# Altium footprint library Transformers.PcbLib: 93 footprints (part 5 of 7)
Each footprint in its own frame and in the unit in brackets; x right, y up, seen from the top. Pads: shape width x height; smd on the part's side, far side on the other; paste and mask are expansions set on the pad; w line width, h text height; cw(c..) or ccw(c..) is an arc to the next point about the centre after c.
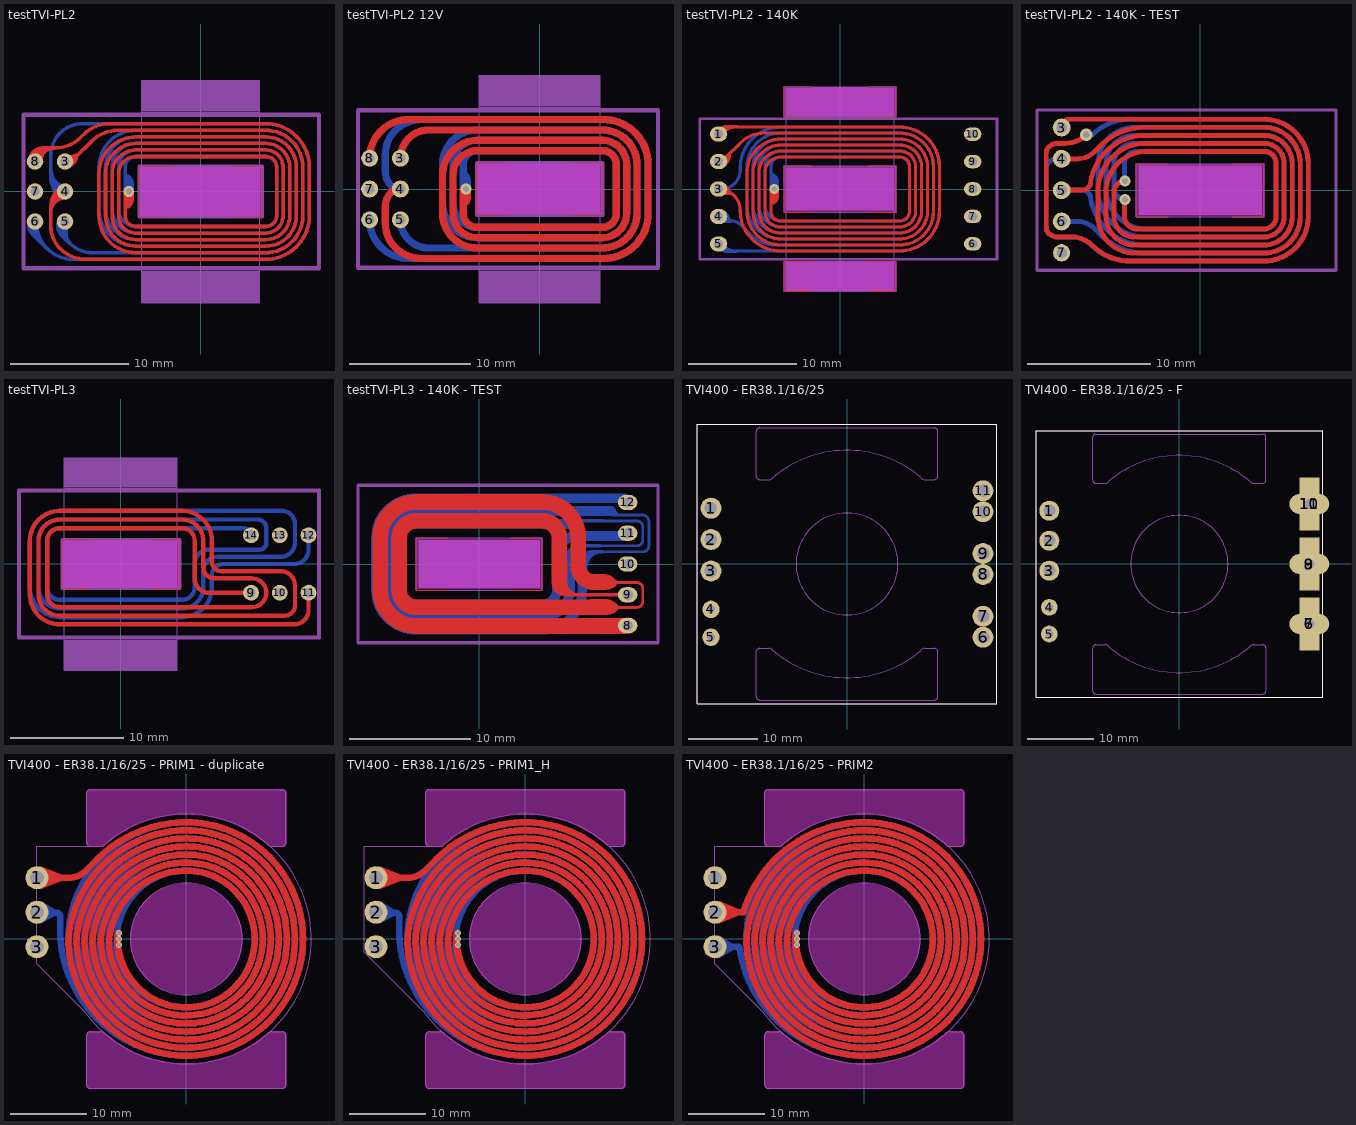
[diagram p4: the footprints below, top view; thin cyan lines are the x and y axes]

## testTVI-PL2 [mm]
pads (6):
  round 1.4 hole 0.8: 3(-11.5,2.54) 4(-11.5,0) 5(-11.5,-2.54) 6(-14.04,-2.54) 7(-14.04,0) 8(-14.04,2.54)
via -6.1,0 diameter 0.9 hole 0.5
Top Layer:
  region: -5.7,0 -5.7,-0.7 -5.7,-0.779 -5.731,-0.933 -5.791,-1.079 -5.879,-1.21 -5.99,-1.321 -6.121,-1.409 -6.267,-1.469 -6.421,-1.5 -6.5,-1.5 -6.5,0 -6.5,0.08 -6.439,0.227 -6.327,0.339 -6.18,0.4 -6.1,0.4
  region: -11.669,1.869 -11.541,1.869 -11.29,1.919 -11.053,2.017 -10.841,2.159 -10.659,2.341 -10.517,2.553 -10.419,2.79 -10.369,3.041 -10.369,3.169 -10.369,3.25 -10.5,3.25 -10.637,3.188 -10.923,3.096 -11.22,3.05 -11.52,3.051 -11.669,3.069
  region: -11.331,0.539 -11.481,0.526 -11.77,0.446 -12.039,0.314 -12.279,0.135 -12.483,-0.086 -12.641,-0.341 -12.75,-0.62 -12.806,-0.915 -12.806,-1.065 -12.806,-1.801 -12.628,-1.801 -12.614,-1.682 -12.552,-1.45 -12.447,-1.236 -12.301,-1.046 -12.122,-0.888 -11.915,-0.768 -11.688,-0.691 -11.451,-0.66 -11.331,-0.661
  region: -14.64,2.54 -14.64,2.668 -14.59,2.919 -14.492,3.156 -14.35,3.369 -14.169,3.55 -13.956,3.692 -13.719,3.79 -13.468,3.84 -13.34,3.84 -12.34,3.84 -12.34,3.54 -12.44,3.54 -12.538,3.535 -12.73,3.497 -12.911,3.422 -13.074,3.313 -13.213,3.174 -13.322,3.011 -13.397,2.83 -13.435,2.638 -13.44,2.54
  lines w0.1: -2.6,-2.15 -5.2,-2.15 -5.2,2.15 -2.6,2.15 ; 2.6,-2.15 5.2,-2.15 5.2,2.15 2.6,2.15
  lines w0.3: -13.763,2.817 -14.04,2.54 -13.238,3.342 ; -12.34,3.69 -12.33,3.69 ccw(c-12.33,6.756) -10.162,4.588 -9.916,4.834 cw(c-7.748,2.666) -7.748,5.732 -6.748,5.732 -5.5,5.732 ; -12.25,-0.25 cw(c-11.646,-0.854) -11.646,0 ; -12.1,0 ccw(c-10.651,-1.449) -12.7,-1.449 -12.7,-2.941 ccw(c-10.023,-2.941) -11.916,-4.834 ccw(c-9.748,-2.666) -9.748,-5.732 -8.248,-5.732 ; -11.852,-0.102 -11.75,0 ; -11.27,2.54 -11.5,2.54 ; -10.646,2.894 cw(c-11.5,3.747) -11.5,2.54 ; -8.748,-5.732 -7.748,-5.732 ; -6.75,-5.732 -7.748,-5.732 ; -6.5,-5.732 -5.5,-5.732 ; -6.412,0 -6.412,-2.05 ccw(c-5.5,-2.05) -5.5,-2.962 5.5,-2.962 ccw(c5.5,-2.05) 6.412,-2.05 6.412,2.05 ccw(c5.5,2.05) 5.5,2.962 -5.5,2.962 ccw(c-5.5,1.496) -6.966,1.496 -6.966,0 -6.966,-2.05 ccw(c-5.5,-2.05) -5.5,-3.516 5.5,-3.516 ccw(c5.5,-2.05) 6.966,-2.05 6.966,2.05 ccw(c5.5,2.05) 5.5,3.516 -5.5,3.516 ccw(c-5.5,1.496) -7.52,1.496 -7.52,0 -7.52,-2.05 ccw(c-5.5,-2.05) -5.5,-4.07 5.5,-4.07 ccw(c5.5,-2.05) 7.52,-2.05 7.52,2.05 ccw(c5.5,2.05) 5.5,4.07 -5.5,4.07 ccw(c-5.5,1.496) -8.074,1.496 -8.074,0 -8.074,-2.05 ccw(c-5.5,-2.05) -5.5,-4.624 5.5,-4.624 ccw(c5.5,-2.05) 8.074,-2.05 8.074,2.05 ccw(c5.5,2.05) 5.5,4.624 -5.5,4.624 ccw(c-5.5,1.496) -8.628,1.496 -8.628,0 -8.628,-2.05 ccw(c-5.5,-2.05) -5.5,-5.178 5.5,-5.178 ccw(c5.5,-2.05) 8.628,-2.05 8.628,2.05 ccw(c5.5,2.05) 5.5,5.178 -5.5,5.178 ; -6,5.732 -5.5,5.732 ; -5.546,5.178 -4,5.178 ; -5,5.178 -6.092,5.178 -7.052,5.178 ccw(c-7.052,2.112) -9.22,4.28 -10.578,2.922 cw(c-11.5,3.844) -11.5,2.54 ; -7.748,-5.732 -5.5,-5.732 ; -5.5,-5.732 5.5,-5.732 ccw(c5.5,-2.05) 9.182,-2.05 9.182,2.05 ccw(c5.5,2.05) 5.5,5.732 -5.5,5.732
Bottom Layer:
  region: -5.7,0 -5.7,0.7 -5.7,0.779 -5.731,0.933 -5.791,1.079 -5.879,1.21 -5.99,1.321 -6.121,1.409 -6.267,1.469 -6.421,1.5 -6.5,1.5 -6.5,0 -6.5,-0.08 -6.439,-0.227 -6.327,-0.339 -6.18,-0.4 -6.1,-0.4
  region: -11.366,-0.677 -11.494,-0.677 -11.745,-0.627 -11.981,-0.529 -12.194,-0.387 -12.375,-0.206 -12.518,0.007 -12.616,0.244 -12.666,0.495 -12.666,0.623 -12.666,1.623 -12.55,1.8 -12.549,1.679 -12.51,1.441 -12.427,1.214 -12.3,1.009 -12.136,0.832 -11.94,0.69 -11.721,0.589 -11.486,0.533 -11.366,0.523
  region: -11.849,-1.985 -11.939,-2.075 -12.081,-2.288 -12.179,-2.525 -12.229,-2.776 -12.229,-3.032 -12.179,-3.283 -12.081,-3.52 -11.939,-3.733 -11.849,-3.823 -11.142,-4.53 -10.929,-4.318 -11,-4.247 -11.066,-4.175 -11.175,-4.012 -11.25,-3.831 -11.288,-3.638 -11.288,-3.442 -11.25,-3.25 -11.175,-3.069 -11.066,-2.906 -11,-2.833
  region: -14.33,-1.889 -14.42,-1.979 -14.562,-2.192 -14.66,-2.429 -14.71,-2.68 -14.71,-2.936 -14.66,-3.187 -14.562,-3.424 -14.42,-3.636 -14.33,-3.727 -13.116,-4.94 -12.905,-4.728 -13.481,-4.151 -13.547,-4.079 -13.656,-3.916 -13.731,-3.734 -13.769,-3.542 -13.769,-3.346 -13.731,-3.154 -13.656,-2.973 -13.547,-2.81 -13.481,-2.737
  lines w0.1: -2.575,-2.1 -5.15,-2.1 -5.15,2.1 -2.575,2.1 ; 2.575,-2.1 5.15,-2.1 5.15,2.1 2.575,2.1
  lines w0.3: -13.907,-2.673 ccw(c-13.905,-2.671) -13.905,-2.674 ccw(c-10.85,-2.674) -13.01,-4.834 ccw(c-10.842,-2.666) -10.842,-5.732 ; -11.803,-0.077 ccw(c-11.803,-0.497) -12.1,-0.2 cw(c-10.651,1.249) -12.7,1.249 -12.7,3.062 cw(c-10.023,3.062) -11.916,4.955 cw(c-10.039,3.078) -10.039,5.732 -10,5.732 -8.798,5.732 -8.198,5.732 -7.5,5.732 ; -11.5,-3.303 ccw(c-9.914,-3.303) -11.036,-4.424 ccw(c-9.216,-2.604) -9.216,-5.178 -8,-5.178 ; -9.498,-5.732 -7.998,-5.732 -6,-5.732 ; -8.9,-5.732 -9.842,-5.732 -10.842,-5.732 ; -8.216,-5.178 -7.682,-5.178 -6.092,-5.178 -4.5,-5.178 ; -8.078,-5.732 -6.999,-5.732 -10.842,-5.732 ; -7.998,5.732 -7.25,5.732 -5.5,5.732 5.5,5.732 cw(c5.5,2.05) 9.182,2.05 9.182,-2.05 cw(c5.5,-2.05) 5.5,-5.732 -5.5,-5.732 -6.25,-5.732 ; -7.748,5.732 -7.624,5.732 ; -6.412,0 -6.412,2.05 cw(c-5.5,2.05) -5.5,2.962 5.5,2.962 cw(c5.5,2.05) 6.412,2.05 6.412,-2.05 cw(c5.5,-2.05) 5.5,-2.962 -5.5,-2.962 cw(c-5.5,-1.496) -6.966,-1.496 -6.966,0 -6.966,2.05 cw(c-5.5,2.05) -5.5,3.516 5.5,3.516 cw(c5.5,2.05) 6.966,2.05 6.966,-2.05 cw(c5.5,-2.05) 5.5,-3.516 -5.5,-3.516 cw(c-5.5,-1.496) -7.52,-1.496 -7.52,0 -7.52,2.05 cw(c-5.5,2.05) -5.5,4.07 5.5,4.07 cw(c5.5,2.05) 7.52,2.05 7.52,-2.05 cw(c5.5,-2.05) 5.5,-4.07 -5.5,-4.07 cw(c-5.5,-1.496) -8.074,-1.496 -8.074,0 -8.074,2.05 cw(c-5.5,2.05) -5.5,4.624 5.5,4.624 cw(c5.5,2.05) 8.074,2.05 8.074,-2.05 cw(c5.5,-2.05) 5.5,-4.624 -5.5,-4.624 cw(c-5.5,-1.496) -8.628,-1.496 -8.628,0 -8.628,2.05 cw(c-5.5,2.05) -5.5,5.178 5.5,5.178 cw(c5.5,2.05) 8.628,2.05 8.628,-2.05 cw(c5.5,-2.05) 5.5,-5.178 -5.5,-5.178
Keep-Out Layer:
  board cut-out: -5.15,2.1 -5.15,-2.1 5.15,-2.1 5.15,2.1
Mechanical 2:
  lines w0.3: -5.2,-2.15 2.6,-2.15 5.2,-2.15 5.2,2.15 2.6,2.15 -5.2,2.15 -5.2,-2.15
  lines w0.35: -15,-6.5 -15,6.5 -3,6.5 10,6.5 10,-6.5 -15,-6.5
Top Assembly:
  rectangle: -5,-9.4 5,-6.8
  rectangle: -5,6.8 5,9.4
  rectangle: -5,-2 5,2
  lines w0.1: -5,-6.75 5,-6.75 ; -5,-1.9 5,-1.9 ; -5,1.9 5,1.9 ; -5,6.75 5,6.75 ; -5,-9.4 -5,0 -5,9.4 5,9.4 5,-9.4 -5,-9.4
3D body: height 4, standoff -4, extent -5,-1.9 5,2

## testTVI-PL2 12V [mm]
pads (6):
  round 1.4 hole 0.8: 3(-11.5,2.54) 4(-11.5,0) 5(-11.5,-2.54) 6(-14.04,-2.54) 7(-14.04,0) 8(-14.04,2.54)
via -6.1,0 diameter 0.9 hole 0.5
Top Layer:
  region: -5.7,0 -5.7,-0.7 -5.7,-0.779 -5.731,-0.933 -5.791,-1.079 -5.879,-1.21 -5.99,-1.321 -6.121,-1.409 -6.267,-1.469 -6.421,-1.5 -6.5,-1.5 -6.5,0 -6.5,0.08 -6.439,0.227 -6.327,0.339 -6.18,0.4 -6.1,0.4
  lines w0.1: -2.6,-2.15 -5.2,-2.15 -5.2,2.15 -2.6,2.15 ; 2.6,-2.15 5.2,-2.15 5.2,2.15 2.6,2.15
  lines w0.3: -14.04,2.54 -13.763,2.817
  lines w0.6: -14.04,2.54 cw(c-10.848,2.54) -10.848,5.732 -7.248,5.732 ; -11.646,0 ccw(c-11.646,-0.854) -12.25,-0.25 ccw(c-11.043,-1.457) -12.75,-1.457 -12.75,-2.821 ccw(c-9.903,-2.821) -11.916,-4.834 ; -11.5,2.54 cw(c-9.17,2.54) -9.17,4.87 -4.75,4.87 ; -8.748,-5.732 -7.748,-5.732 ; -8.248,-5.732 -9.748,-5.732 ; -7.748,5.732 -6.748,5.732 -5.5,5.732 ; -6.75,-5.732 -7.748,-5.732 ; -6.5,-5.732 -5.5,-5.732 ; -6.312,0 -6.312,-2 ccw(c-5.15,-2) -5.15,-3.162 5.15,-3.162 ccw(c5.15,-2) 6.312,-2 6.312,2 ccw(c5.15,2) 5.15,3.162 -5.15,3.162 ccw(c-5.15,1.146) -7.166,1.146 -7.166,0 -7.166,-2 ccw(c-5.15,-2) -5.15,-4.016 5.15,-4.016 ccw(c5.15,-2) 7.166,-2 7.166,2 ccw(c5.15,2) 5.15,4.016 -5.15,4.016 ccw(c-5.15,1.146) -8.02,1.146 -8.02,0 -8.02,-2 ccw(c-5.15,-2) -5.15,-4.87 5.15,-4.87 ccw(c5.15,-2) 8.02,-2 8.02,2 ccw(c5.15,2) 5.15,4.87 -5.15,4.87 ; -6,5.732 -5.5,5.732 ; 5.25,-5.732 ccw(c5.25,-2.05) 8.932,-2.05 8.932,2.05 ccw(c5.25,2.05) 5.25,5.732 ; 5.5,-5.732 -5.5,-5.732 ; 5.5,5.732 -5.5,5.732 ; -11.916,-4.834 ccw(c-9.748,-2.666) -9.748,-5.732 ; -11.916,-4.834 ccw(c-9.748,-2.666) -9.748,-5.732 ; -7.748,-5.732 -5.5,-5.732 ; -11.852,-0.102 -11.75,0 -11.852,-0.102
Bottom Layer:
  region: -5.7,0 -5.7,0.7 -5.7,0.779 -5.731,0.933 -5.791,1.079 -5.879,1.21 -5.99,1.321 -6.121,1.409 -6.267,1.469 -6.421,1.5 -6.5,1.5 -6.5,0 -6.5,-0.08 -6.439,-0.227 -6.327,-0.339 -6.18,-0.4 -6.1,-0.4
  lines w0.1: -2.575,-2.1 -5.15,-2.1 -5.15,2.1 -2.575,2.1 ; 2.575,-2.1 5.15,-2.1 5.15,2.1 2.575,2.1
  lines w0.3: -14.04,-2.54 -13.763,-2.817
  lines w0.6: -14.04,-2.54 ccw(c-10.848,-2.54) -10.848,-5.732 -7.748,-5.732 -6.748,-5.732 -5.5,-5.732 ; -11.852,0.102 -11.75,0 ; -11.646,0 cw(c-11.646,0.854) -12.25,0.25 cw(c-11.043,1.457) -12.75,1.457 -12.75,2.821 cw(c-9.903,2.821) -11.916,4.834 cw(c-9.748,2.666) -9.748,5.732 -8.248,5.732 ; -11.5,-2.54 ccw(c-9.17,-2.54) -9.17,-4.87 -5,-4.87 ; -8.748,5.732 -7.748,5.732 ; -6.75,5.732 -7.748,5.732 ; -6.5,5.732 -5.5,5.732 ; -6.312,0 -6.312,2 cw(c-5.15,2) -5.15,3.162 5.15,3.162 cw(c5.15,2) 6.312,2 6.312,-2 cw(c5.15,-2) 5.15,-3.162 -5.15,-3.162 cw(c-5.15,-1.146) -7.166,-1.146 -7.166,0 -7.166,2 cw(c-5.15,2) -5.15,4.016 5.15,4.016 cw(c5.15,2) 7.166,2 7.166,-2 cw(c5.15,-2) 5.15,-4.016 -5.15,-4.016 cw(c-5.15,-1.146) -8.02,-1.146 -8.02,0 -8.02,2 cw(c-5.15,2) -5.15,4.87 5.15,4.87 cw(c5.15,2) 8.02,2 8.02,-2 cw(c5.15,-2) 5.15,-4.87 -5.15,-4.87 ; -6,-5.732 -5.5,-5.732 ; 5.25,-5.732 ccw(c5.25,-2.05) 8.932,-2.05 8.932,2.05 ccw(c5.25,2.05) 5.25,5.732 ; 5.5,-5.732 -5.5,-5.732 ; 5.5,5.732 -5.5,5.732 ; -7.748,5.732 -5.5,5.732
Keep-Out Layer:
  board cut-out: -5.15,2.1 -5.15,-2.1 5.15,-2.1 5.15,2.1
Mechanical 2:
  lines w0.3: -5.2,-2.15 2.6,-2.15 5.2,-2.15 5.2,2.15 2.6,2.15 -5.2,2.15 -5.2,-2.15
  lines w0.35: -15,-6.5 -15,6.5 -3,6.5 9.75,6.5 9.75,-6.5 -15,-6.5
Top Assembly:
  rectangle: -5,-9.4 5,-6.8
  rectangle: -5,6.8 5,9.4
  rectangle: -5,-2 5,2
  lines w0.1: -5,-6.75 5,-6.75 ; -5,-1.9 5,-1.9 ; -5,1.9 5,1.9 ; -5,6.75 5,6.75 ; -5,-9.4 -5,0 -5,9.4 5,9.4 5,-9.4 -5,-9.4
3D body: height 4, standoff -4, extent -5,-1.9 5,2

## testTVI-PL2 - 140K [mm]
pads (10):
  oval 1.6x1.4 hole 0.85: 1(-11.25,5.08) 2(-11.25,2.54) 3(-11.25,0) 4(-11.25,-2.54) 5(-11.25,-5.08)
  oval 1.6x1.25 hole 0.85: 6(12.25,-5.08) 7(12.25,-2.54) 8(12.25,0) 9(12.25,2.54) 10(12.25,5.08)
via -6.1,0 diameter 0.9 hole 0.5
Top Layer:
  region: -11.419,1.869 -11.291,1.869 -11.04,1.919 -10.803,2.017 -10.591,2.159 -10.409,2.341 -10.267,2.553 -10.169,2.79 -10.119,3.041 -10.119,3.169 -10.119,3.25 -10.25,3.25 -10.387,3.188 -10.673,3.096 -10.97,3.05 -11.27,3.051 -11.419,3.069
  region: -5.7,0 -5.7,-0.7 -5.7,-0.779 -5.731,-0.933 -5.791,-1.079 -5.879,-1.21 -5.99,-1.321 -6.121,-1.409 -6.267,-1.469 -6.421,-1.5 -6.5,-1.5 -6.5,0 -6.5,0.08 -6.439,0.227 -6.327,0.339 -6.18,0.4 -6.1,0.4
  region: -11.7,4.6 -11.706,4.709 -11.679,4.927 -11.615,5.136 -11.514,5.331 -11.381,5.505 -11.219,5.653 -11.034,5.77 -10.831,5.852 -10.724,5.875 -9.536,5.875 -9.536,5.6 -9.636,5.6 -9.744,5.605 -9.96,5.582 -10.166,5.517 -10.357,5.414 -10.523,5.275 -10.659,5.107 -10.76,4.915 -10.821,4.707 -10.836,4.6
  region: -11.419,0.671 -11.296,0.675 -11.054,0.637 -10.823,0.551 -10.614,0.422 -10.433,0.255 -10.289,0.056 -10.187,-0.167 -10.13,-0.406 -10.125,-0.529 -11.419,-0.529
  lines w0.1: -2.6,-9.45 -5.2,-9.45 -5.2,-6.7 -2.6,-6.7 ; -2.6,-2.15 -5.2,-2.15 -5.2,2.15 -2.6,2.15 ; -2.6,6.7 -5.2,6.7 -5.2,9.45 -2.6,9.45 ; 2.6,-9.45 5.2,-9.45 5.2,-6.7 2.6,-6.7 ; 2.6,-2.15 5.2,-2.15 5.2,2.15 2.6,2.15 ; 2.6,6.7 5.2,6.7 5.2,9.45 2.6,9.45
  lines w0.3: -11.5,0 -11.25,0 cw(c-11.25,-2) -9.25,-2 ccw(c-5.518,-2) -5.518,-5.732 -5.5,-5.732 5.5,-5.732 ccw(c5.5,-2.05) 9.182,-2.05 9.182,2.05 ccw(c5.5,2.05) 5.5,5.732 -5.5,5.732 ; -11.27,2.54 -11.5,2.54 ; -11.25,5.08 cw(c-9.676,3.506) -9.676,5.732 -4,5.732 ; -10.646,2.894 cw(c-11.5,3.747) -11.5,2.54 ; -7.748,5.732 -6.748,5.732 -5.5,5.732 ; -6.412,0 -6.412,-2.05 ccw(c-5.5,-2.05) -5.5,-2.962 5.5,-2.962 ccw(c5.5,-2.05) 6.412,-2.05 6.412,2.05 ccw(c5.5,2.05) 5.5,2.962 -5.5,2.962 ccw(c-5.5,1.496) -6.966,1.496 -6.966,0 -6.966,-2.05 ccw(c-5.5,-2.05) -5.5,-3.516 5.5,-3.516 ccw(c5.5,-2.05) 6.966,-2.05 6.966,2.05 ccw(c5.5,2.05) 5.5,3.516 -5.5,3.516 ccw(c-5.5,1.496) -7.52,1.496 -7.52,0 -7.52,-2.05 ccw(c-5.5,-2.05) -5.5,-4.07 5.5,-4.07 ccw(c5.5,-2.05) 7.52,-2.05 7.52,2.05 ccw(c5.5,2.05) 5.5,4.07 -5.5,4.07 ccw(c-5.5,1.496) -8.074,1.496 -8.074,0 -8.074,-2.05 ccw(c-5.5,-2.05) -5.5,-4.624 5.5,-4.624 ccw(c5.5,-2.05) 8.074,-2.05 8.074,2.05 ccw(c5.5,2.05) 5.5,4.624 -5.5,4.624 ccw(c-5.5,1.496) -8.628,1.496 -8.628,0 -8.628,-2.05 ccw(c-5.5,-2.05) -5.5,-5.178 5.5,-5.178 ccw(c5.5,-2.05) 8.628,-2.05 8.628,2.05 ccw(c5.5,2.05) 5.5,5.178 -5.5,5.178 ; -6,5.732 -5.5,5.732 ; -5.546,5.178 -4,5.178 ; -5,5.178 -6.092,5.178 -7.052,5.178 ccw(c-7.052,2.112) -9.22,4.28 -10.578,2.922 cw(c-11.5,3.844) -11.5,2.54
  text "1" at 5.5,1.5 h0.5
Bottom Layer:
  region: -11.7,-4.6 -11.706,-4.709 -11.679,-4.927 -11.615,-5.136 -11.514,-5.331 -11.381,-5.505 -11.219,-5.653 -11.034,-5.77 -10.831,-5.852 -10.724,-5.875 -9.536,-5.875 -9.536,-5.6 -9.636,-5.6 -9.744,-5.605 -9.96,-5.582 -10.166,-5.517 -10.357,-5.414 -10.523,-5.275 -10.659,-5.107 -10.76,-4.915 -10.821,-4.707 -10.836,-4.6
  region: -5.7,0 -5.7,0.7 -5.7,0.779 -5.731,0.933 -5.791,1.079 -5.879,1.21 -5.99,1.321 -6.121,1.409 -6.267,1.469 -6.421,1.5 -6.5,1.5 -6.5,0 -6.5,-0.08 -6.439,-0.227 -6.327,-0.339 -6.18,-0.4 -6.1,-0.4
  region: -11.419,-1.869 -11.294,-1.865 -11.048,-1.905 -10.814,-1.993 -10.603,-2.126 -10.422,-2.298 -10.279,-2.502 -10.179,-2.731 -10.126,-2.975 -10.124,-3.1 -11.419,-3.1
  lines w0.1: -2.6,-9.45 -5.2,-9.45 -5.2,-6.7 -2.6,-6.7 ; -2.6,-2.15 -5.2,-2.15 -5.2,2.15 -2.6,2.15 ; -2.6,6.7 -5.2,6.7 -5.2,9.45 -2.6,9.45 ; 2.6,-9.45 5.2,-9.45 5.2,-6.7 2.6,-6.7 ; 2.6,-2.15 5.2,-2.15 5.2,2.15 2.6,2.15 ; 2.6,6.7 5.2,6.7 5.2,9.45 2.6,9.45
  lines w0.3: -11.25,-5.08 ccw(c-10.598,-5.08) -10.598,-5.732 -5.5,-5.732 5.5,-5.732 ccw(c5.5,-2.05) 9.182,-2.05 9.182,2.05 ccw(c5.5,2.05) 5.5,5.732 -5.5,5.732 ccw(c-5.5,1.982) -9.25,1.982 -9.25,1.75 cw(c-11,1.75) -11,0 -11.25,0 ; -11.25,-2.54 ccw(c-10.269,-1.559) -10.269,-2.946 -10.13,-2.946 cw(c-10.13,-4.337) -9.146,-3.354 -9.048,-3.452 -8.192,-4.308 ccw(c-6.092,-2.209) -6.092,-5.178 -4.5,-5.178 ; -6.412,0 -6.412,2.05 cw(c-5.5,2.05) -5.5,2.962 5.5,2.962 cw(c5.5,2.05) 6.412,2.05 6.412,-2.05 cw(c5.5,-2.05) 5.5,-2.962 -5.5,-2.962 cw(c-5.5,-1.496) -6.966,-1.496 -6.966,0 -6.966,2.05 cw(c-5.5,2.05) -5.5,3.516 5.5,3.516 cw(c5.5,2.05) 6.966,2.05 6.966,-2.05 cw(c5.5,-2.05) 5.5,-3.516 -5.5,-3.516 cw(c-5.5,-1.496) -7.52,-1.496 -7.52,0 -7.52,2.05 cw(c-5.5,2.05) -5.5,4.07 5.5,4.07 cw(c5.5,2.05) 7.52,2.05 7.52,-2.05 cw(c5.5,-2.05) 5.5,-4.07 -5.5,-4.07 cw(c-5.5,-1.496) -8.074,-1.496 -8.074,0 -8.074,2.05 cw(c-5.5,2.05) -5.5,4.624 5.5,4.624 cw(c5.5,2.05) 8.074,2.05 8.074,-2.05 cw(c5.5,-2.05) 5.5,-4.624 -5.5,-4.624 cw(c-5.5,-1.496) -8.628,-1.496 -8.628,0 -8.628,2.05 cw(c-5.5,2.05) -5.5,5.178 5.5,5.178 cw(c5.5,2.05) 8.628,2.05 8.628,-2.05 cw(c5.5,-2.05) 5.5,-5.178 -5.5,-5.178 ; -5.268,5.732 -5.25,5.732
  text "2" at 5.7,-1.7 h0.5
Keep-Out Layer:
  board cut-out: -5.15,2.1 -5.15,-2.1 5.15,-2.1 5.15,2.1
  board cut-out: -5.15,-6.75 -5.15,-9.4 5.15,-9.4 5.15,-6.75
  board cut-out: -5.15,9.4 -5.15,6.75 5.15,6.75 5.15,9.4
Mechanical 1:
  lines w0.254: -13,-6.5 -13,6.5 -5.5,6.5 14.5,6.5 14.5,-6.5 -13,-6.5
Mechanical 2:
  lines w0.1: -5.2,-9.45 -5.2,-6.7 2.6,-6.7 5.2,-6.7 5.2,-9.45 2.6,-9.45 -5.2,-9.45 ; -5.2,-2.15 2.6,-2.15 5.2,-2.15 5.2,2.15 2.6,2.15 -5.2,2.15 -5.2,-2.15 ; -5.2,6.7 -5.2,9.45 2.6,9.45 5.2,9.45 5.2,6.7 2.6,6.7 -5.2,6.7
Top Assembly:
  rectangle: -5,6.75 5,9.35
  rectangle: -5,-2 5,2
  rectangle: -5,-9.4 5,-6.8
  lines w0.1: -5,-6.75 5,-6.75 ; -5,-1.9 5,-1.9 ; -5,1.9 5,1.9 ; -5,6.75 5,6.75 ; -5,-9.4 -5,0 -5,9.4 5,9.4 5,-9.4 -5,-9.4
3D body: height 4, standoff -4, extent -5,6.75 5,9.4
3D body: height 4, standoff -4, extent -5,-9.45 5,-6.8
3D body: height 4, standoff -4, extent -5,-1.9 5,2
3D body: height 4, standoff 2, extent -5.15,-9.4 5.15,9.4
3D body: height 4, standoff 2, extent -5.15,-9.4 5.15,9.4

## testTVI-PL2 - 140K - TEST [mm]
pads (5):
  round 1.45 hole 0.85: 3(-11.25,5.08) 4(-11.25,2.54) 5(-11.25,0) 6(-11.25,-2.54)
  round 1.4 hole 0.85: 7(-11.25,-5.08)
via -6.1,0.75 diameter 0.9 hole 0.5
via -6.1,-0.75 diameter 0.9 hole 0.5
via -9.25,4.5 diameter 1 hole 0.5
Top Layer:
  lines w0.1: -2.6,-2.15 -5.2,-2.15 -5.2,2.15 -2.6,2.15 ; 2.6,-2.15 5.2,-2.15 5.2,2.15 2.6,2.15
  lines w0.4: -12.5,-3.117 -12.5,3.117 ; -12.5,-3.017 ccw(c-11.817,-3.017) -12.3,-3.5 ccw(c-11.576,-2.776) -11.576,-3.8 -10.401,-3.8 cw(c-10.401,-6.096) -8.778,-4.472 ccw(c-5.693,-1.388) -5.693,-5.75 -5.15,-5.75 5.15,-5.75 ccw(c5.15,-2.15) 8.75,-2.15 8.75,2.15 ccw(c5.15,2.15) 5.15,5.75 -5.15,5.75 -10.58,5.75 ccw(c-10.58,5.08) -11.25,5.08 ; -12.5,3.017 cw(c-11.817,3.017) -12.3,3.5 cw(c-11.576,2.776) -11.576,3.8 -11,3.8 ; -11.288,3.8 -10.94,3.8 ccw(c-10.94,6.19) -9.25,4.5 ; -11.25,0 -9.9,0 -9.59,0 ccw(c-9.59,0.699) -8.891,0.699 cw(c-4.477,-0.023) -4.477,4.45 5.15,4.45 cw(c5.15,2.15) 7.45,2.15 7.45,-2.15 cw(c5.15,-2.15) 5.15,-4.45 -5.15,-4.45 ; -11.25,2.54 -9.979,2.54 ccw(c-9.979,4.518) -8.581,3.119 -8.2,3.5 ; -8.204,3.504 cw(c-4.497,-0.003) -4.497,5.1 5.15,5.1 cw(c5.15,2.15) 8.1,2.15 8.1,-2.15 cw(c5.15,-2.15) 5.15,-5.1 -5.15,-5.1 ; -6.15,-0.75 -6.15,-2.15 ccw(c-5.15,-2.15) -5.15,-3.15 5.15,-3.15 ccw(c5.15,-2.15) 6.15,-2.15 6.15,2.15 ccw(c5.15,2.15) 5.15,3.15 -4.331,3.15 ccw(c-4.331,-0.169) -7.65,-0.169 -7.65,-2.15 ; -6.1,0.75 ccw(c-6.1,-0.15) -7,-0.15 -7,-0.25 -7,-2.15 ccw(c-5.35,-2.15) -5.35,-3.8 ; -5.35,-5.1 cw(c-5.35,-2.15) -8.3,-2.15 ; -5.35,-4.45 cw(c-5.35,-2.15) -7.65,-2.15 ; -5.15,-3.8 5.15,-3.8 ccw(c5.15,-2.15) 6.8,-2.15 6.8,2.15 ccw(c5.15,2.15) 5.15,3.8 -4.43,3.8 ccw(c-4.43,-0.07) -8.3,-0.07 -8.3,-2.15 ; -8.3,-2.15 ccw(c-8.3,-2.15) -8.3,-2.15 ; -7.65,-2.15 ccw(c-7.65,-2.15) -7.65,-2.15
  text "1" at 5.5,1.5 h0.5
Bottom Layer:
  lines w0.1: -2.6,-2.15 -5.2,-2.15 -5.2,2.15 -2.6,2.15 ; 2.6,-2.15 5.2,-2.15 5.2,2.15 2.6,2.15
  lines w0.4: -12.5,-3.117 -12.5,1.767 cw(c-11.817,1.767) -12.3,2.25 cw(c-11.576,1.526) -11.576,2.55 ; -12.5,-3.017 ccw(c-11.817,-3.017) -12.3,-3.5 ccw(c-11.576,-2.776) -11.576,-3.8 -11,-3.8 ; -11.288,-3.8 -10.439,-3.8 cw(c-10.439,-6.096) -8.815,-4.472 ccw(c-5.731,-1.388) -5.731,-5.75 -5.15,-5.75 5.15,-5.75 ccw(c5.15,-2.15) 8.75,-2.15 8.75,2.15 ccw(c5.15,2.15) 5.15,5.75 -5.15,5.75 -5.693,5.75 ccw(c-5.693,1.388) -8.778,4.472 ; -11.25,-2.54 -9.979,-2.54 cw(c-9.979,-4.518) -8.581,-3.119 -8.2,-3.5 ; -11.25,0 -9.9,0 -9.59,0 cw(c-9.59,-0.699) -8.891,-0.699 ccw(c-4.477,0.023) -4.477,-4.45 5.15,-4.45 ccw(c5.15,-2.15) 7.45,-2.15 7.45,2.15 ccw(c5.15,2.15) 5.15,4.45 -5.15,4.45 ; -8.204,-3.504 ccw(c-4.497,0.003) -4.497,-5.1 5.15,-5.1 ccw(c5.15,-2.15) 8.1,-2.15 8.1,2.15 ccw(c5.15,2.15) 5.15,5.1 -5.15,5.1 ; -6.15,0.75 -6.15,2.15 cw(c-5.15,2.15) -5.15,3.15 5.15,3.15 cw(c5.15,2.15) 6.15,2.15 6.15,-2.15 cw(c5.15,-2.15) 5.15,-3.15 -4.331,-3.15 cw(c-4.331,0.169) -7.65,0.169 -7.65,2.15 ; -6.1,-0.75 cw(c-6.1,0.15) -7,0.15 -7,0.25 -7,2.15 cw(c-5.35,2.15) -5.35,3.8 ; -5.35,4.45 ccw(c-5.35,2.15) -7.65,2.15 ; -5.35,5.1 ccw(c-5.35,2.15) -8.3,2.15 ; -5.15,3.8 5.15,3.8 cw(c5.15,2.15) 6.8,2.15 6.8,-2.15 cw(c5.15,-2.15) 5.15,-3.8 -4.43,-3.8 cw(c-4.43,0.07) -8.3,0.07 -8.3,2.15 ; -8.3,2.15 ccw(c-8.3,2.15) -8.3,2.15 ; -7.65,2.15 ccw(c-7.65,2.15) -7.65,2.15
  text "2" at 5.7,-1.7 h0.5
Keep-Out Layer:
  board cut-out: -5.15,2.1 -5.15,-2.1 5.15,-2.1 5.15,2.1
Mechanical 1:
  lines w0.254: -13.25,-6.5 11,-6.5 11,6.5 -5.5,6.5 -13.25,6.5 -13.25,-6.5
Mechanical 2:
  lines w0.1: -5.2,-2.15 -5.2,2.15 2.6,2.15 5.2,2.15 5.2,-2.15 2.6,-2.15 -5.2,-2.15
Top Assembly:
  rectangle: -5,-2 5,2
3D body: height 4, standoff -4, extent -5,-1.9 5,2
